# Altium footprint library hphonglib.PcbLib: 1250 footprints (part 59 of 79)
Each footprint in its own frame and in the unit in brackets; x right, y up, seen from the top. Pads: shape width x height; smd on the part's side, far side on the other; paste and mask are expansions set on the pad; w line width, h text height; cw(c..) or ccw(c..) is an arc to the next point about the centre after c.
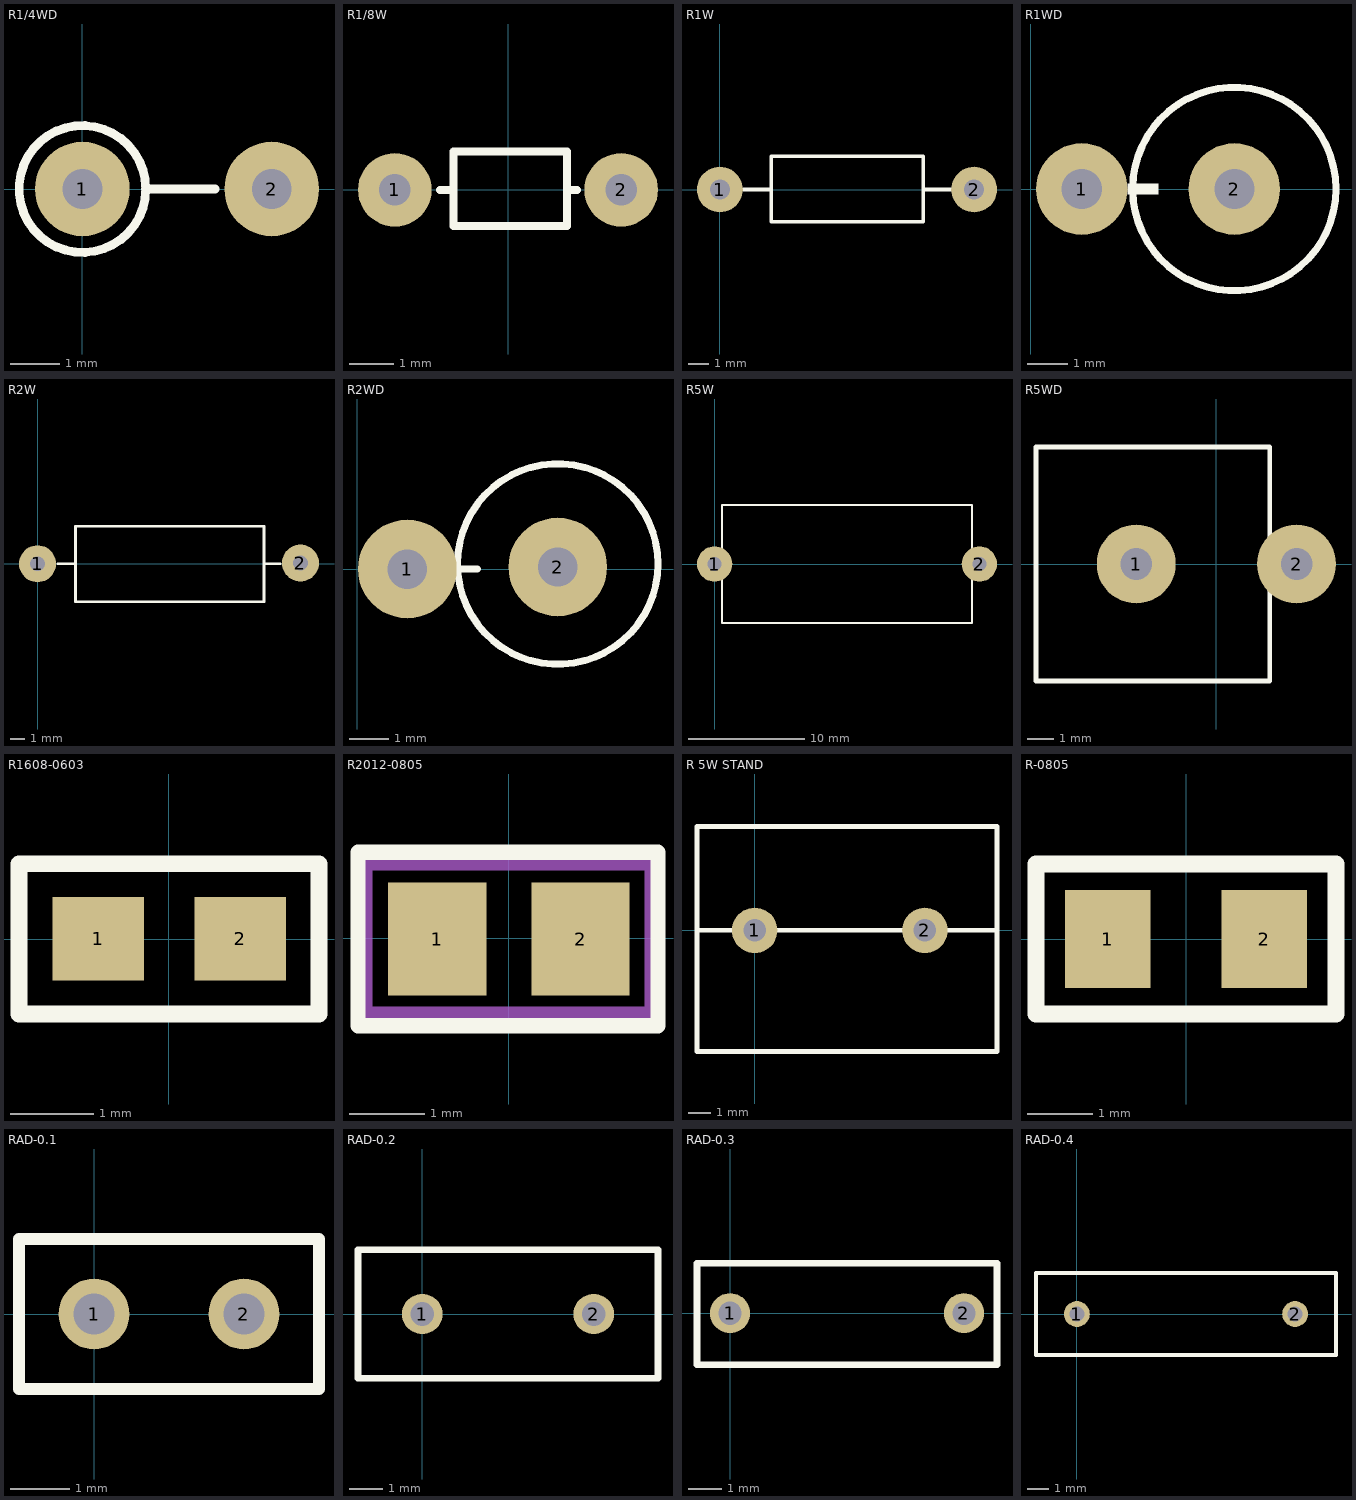
[diagram p58: the footprints below, top view; thin cyan lines are the x and y axes]

## R1/4WD [mm] "R 1/4W, 2 Pin, 150mil"
height 2.54
pads (2):
  round 1.905 hole 0.8: 1(0,0) 2(3.81,0)
Top Overlay:
  circle w0.178: c0,0 r1.276
  lines w0.178: 1.27,0 2.667,0
3D body "SW3DPS-0_5W METAL FILM RESISTOR-DEFAULT.STEP": height 13.42, standoff -4.28, extent -1.778,-1.7 4.322,1.7

## R1/8W [mil] "R 1/8W, 2 pin, 300mil"
height 100
pads (2):
  round 65 hole 28: 1(-100,0) 2(100,0)
Top Overlay:
  lines w7: -60,0 -48,0 ; 54,0 61,0 ; -48,-32 52,-32 52,34 -48,34 -48,-32
3D body "SW3dPS-Res_Normal (0.25W).STEP": height 86.31, standoff -68.11, extent -135,-35.48 135,37

## R1W [mil] "R 1W, 2 pin, 500mil"
height 100
pads (2):
  round 90 hole 39.37: 1(0,0) 2(500,0)
Top Overlay:
  lines w7: 46,0 101,0 ; 400,0 460,0 ; 101,0 101,65 400,65 400,-63 101,-63 101,0

## R1WD [mil] "R 1W, 2 pin, 500mil"
height 100
pads (2):
  round 90 hole 39.37: 1(50,0) 2(200,0)
Top Overlay:
  circle w7: c200,0 r100
  region: 125,5 125,-5 95,-5 95,5

## R2W [mm] "R2W, 2 pin, 700mil"
height 5.08
pads (2):
  round 2.5 hole 1: 1(0,0) 2(17.755,0.051)
Top Overlay:
  lines w0.178: 1.372,0 2.565,0 ; 15.316,0 16.383,0 ; 2.565,0 2.565,2.54 15.291,2.54 15.291,-2.565 2.565,-2.565 2.565,0
3D body "SW3dPS-AXIAL_RESISTOR(3W).STEP": height 8.3, standoff -2, extent -2.362,-3.327 19.838,3.273

## R2WD [mm] "R2W, 2 pin, 700mil"
height 5.08
pads (2):
  round 2.5 hole 1: 1(1.27,0) 2(5.08,0.051)
Top Overlay:
  circle w0.178: c5.08,0.127 r2.54
  lines w0.178: 2.159,0 3.048,0

## R5W [mil] "R5W , 2 pin, 400 x 950mil"
height 400
pads (2):
  round 120 hole 47.24: 1(0,0) 2(900,0)
Top Overlay:
  lines w7: 25,-200 25,200 875,200 875,-200 25,-200
3D body "User Library-5W Resistor.STEP": height 362.6, standoff -98.43, extent -84.69,-190 954.68,191.89

## R5WD [mm] "R5W , 2 pin, 300 x 600 mil"
height 10.16
pads (2):
  round 3 hole 1.2: 1(-3.048,0) 2(3.048,0)
Top Overlay:
  lines w0.178: -6.858,-4.445 2.032,-4.445 2.032,4.445 -6.858,4.445 -6.858,-4.445
3D body "SW3dPS-5W Res.STEP": height 23.05, standoff -2.4, extent -8.648,-5.08 4.432,4.92

## R1608-0603 [mm] "Resister Chip 0603 package"
pads (2):
  rect 1.1x1 smd: 1(-0.843,0.001) 2(0.857,0.001)
Top Overlay:
  lines w0.2: 1.8,-0.9 1.8,0.9 ; 1.8,-0.899 -1.793,-0.899 -1.793,0.901 1.8,0.901
3D body: height 0.3, standoff 0, extent 0.356,-0.432 0.711,0.432
3D body: height 0.3, standoff 0, extent -0.711,-0.432 -0.356,0.432
3D body: height 0.25, standoff 0, extent -0.356,-0.406 0.356,0.406

## R2012-0805 [mm] "Resister Chip 0805 package"
pads (2):
  rect 1.3x1.5 smd: 1(-0.945,-0.007) 2(0.955,-0.007)
Top Overlay:
  lines w0.2: 1.95,-1.157 -1.995,-1.157 -1.995,1.143 1.975,1.143 ; 1.98,-1.157 1.98,1.143
Mechanical 13:
  lines w0.2: -1.9,-1 -1.9,1 1.9,1 1.9,-1 -1.7,-1 -1.9,-1
3D body: height 0.41, standoff 0, extent -0.889,-0.584 -0.381,0.584
3D body: height 0.41, standoff 0, extent 0.381,-0.584 0.889,0.584
3D body: height 0.38, standoff 0, extent -0.381,-0.572 0.381,0.572

## R 5W STAND [mm]
pads (2):
  round 2 / inner round 1.2 / far side round 2 hole 1: 1(0,0) 2(7.493,0)
Top Overlay:
  lines w0.2: -2.54,0 2,0 10.668,0 ; -2.54,-5.334 -2.54,4.572 10.668,4.572 10.668,-5.334 3.841,-5.334 -2.54,-5.334
3D body "User Library-5W Res.step": height 23.05, standoff -2.4, extent -2.476,-5.428 10.604,4.572

## R-0805 [mm] "Chip Resistor; Body 2.0 x 1.3 mm (LxW typ) [2012]"
height 0.65
pads (2):
  rect 1.3x1.5 smd: 1(-1.194,0) 2(1.194,0)
Top Overlay:
  lines w0.254: -2.286,-1.143 2.286,-1.143 2.286,1.143 -2.286,1.143 -2.286,-1.143
3D body "User Library-Chip Resistor2.STEP": height 0.63, standoff 0, extent -0.95,-0.65 0.95,0.65

## RAD-0.1 [mm] "Cap 200x100 - 100"
pads (2):
  round 1.2 hole 0.7: 1(0,0) 2(2.54,0)
Top Overlay:
  lines w0.2: -1.27,-1.27 -1.27,1.27 3.81,1.27 3.81,-1.27 -1.27,-1.27

## RAD-0.2 [mm] "Cap 350x150 - 200"
pads (2):
  round 1.2 hole 0.7: 1(0,0) 2(5.08,0)
Top Overlay:
  lines w0.2: -1.905,-1.905 6.985,-1.905 6.985,1.905 -1.905,1.905 -1.905,-1.905

## RAD-0.3 [mm] "Cap 450x150 - 300"
height 6
pads (2):
  round 1.2 hole 0.7: 1(0,0) 2(7.01,0)
Top Overlay:
  lines w0.2: -0.991,-1.549 8.001,-1.549 8.001,1.499 -0.991,1.499 -0.991,-1.549
3D body "C104.STEP": height 9.03, standoff -4.16, extent -0.495,-1.219 7.506,1.173

## RAD-0.4 [mm] "Cap 550x150 - 400"
pads (2):
  round 1.2 hole 0.7: 1(0,0) 2(10.16,0)
Top Overlay:
  lines w0.2: -1.905,-1.905 -1.905,1.905 12.065,1.905 12.065,-1.905 -1.905,-1.905